# Altium footprint library fszhang.PcbLib: 1032 footprints (part 23 of 66)
Each footprint in its own frame and in the unit in brackets; x right, y up, seen from the top. Pads: shape width x height; smd on the part's side, far side on the other; paste and mask are expansions set on the pad; w line width, h text height; cw(c..) or ccw(c..) is an arc to the next point about the centre after c.
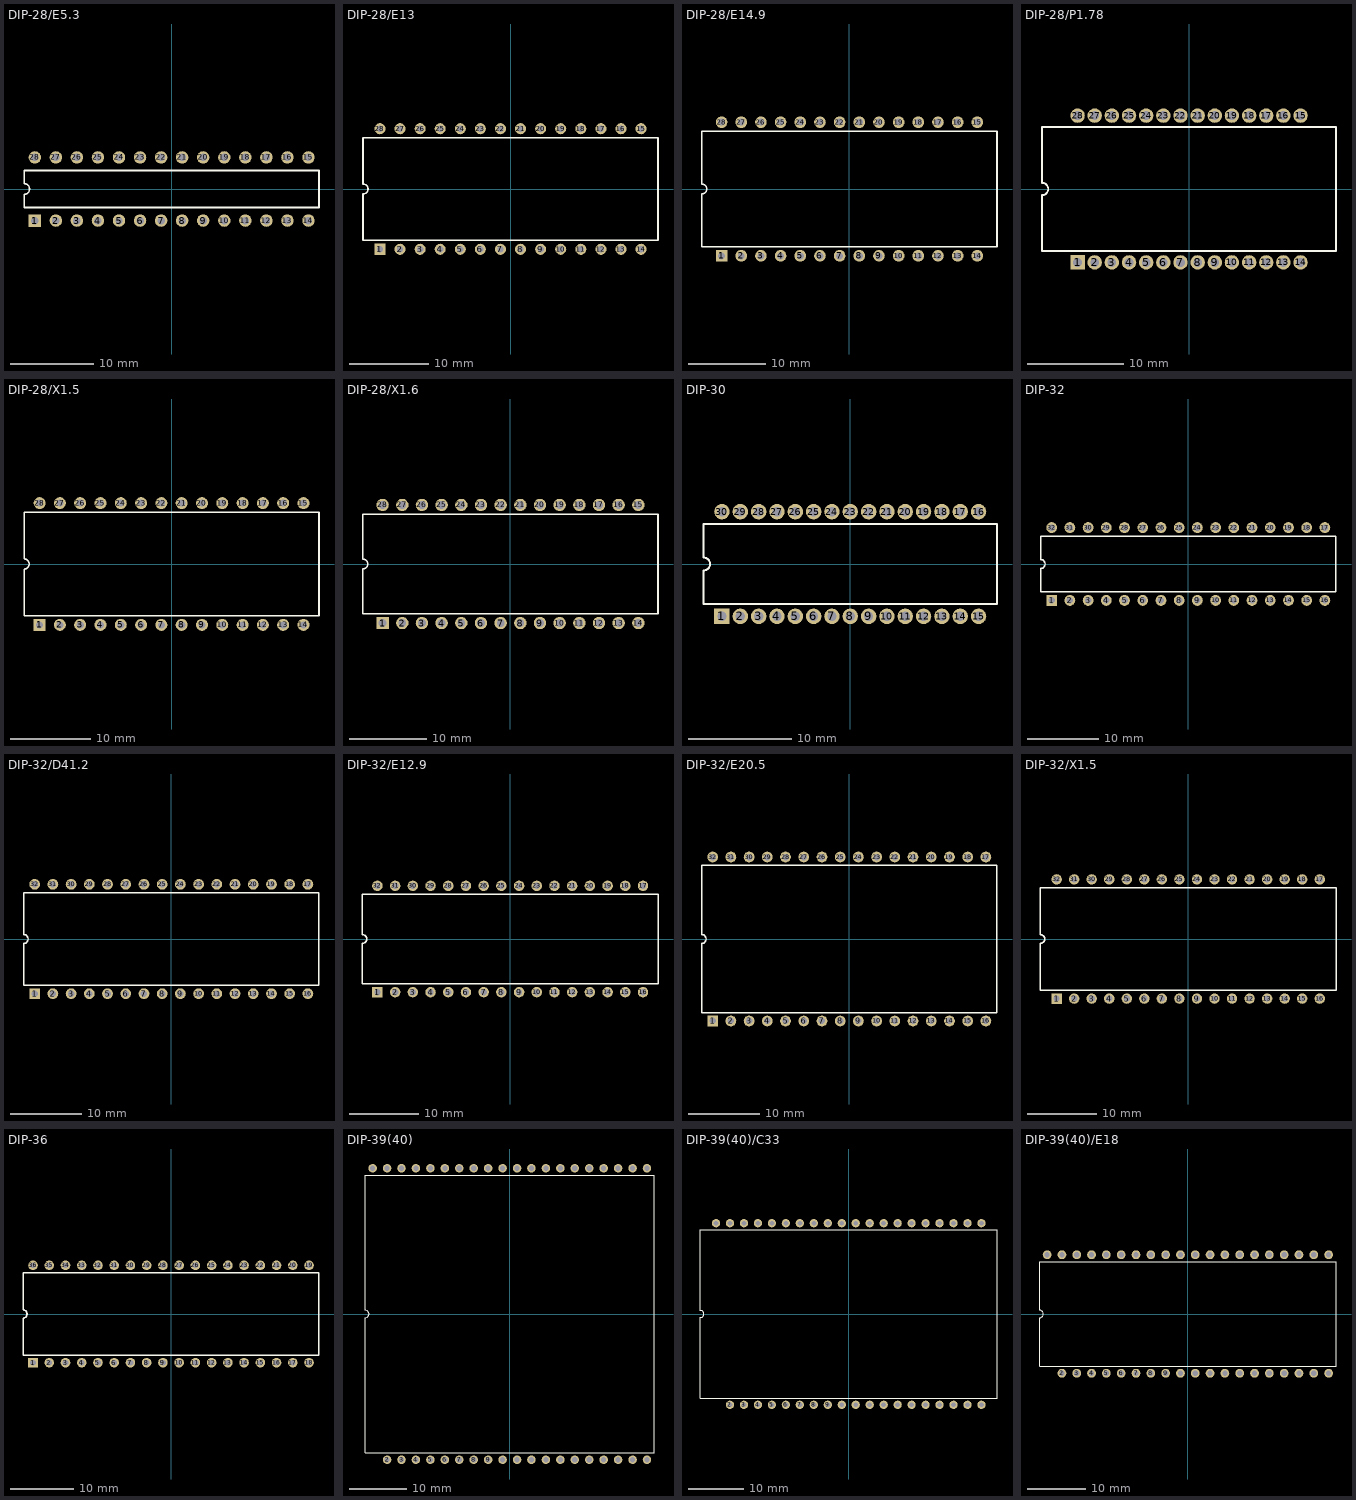
[diagram p22: the footprints below, top view; thin cyan lines are the x and y axes]

## DIP-28/E5.3 [mm]
pads (28):
  rect 1.5x1.5 hole 0.9: 1(-16.51,-3.81)
  round 1.5 hole 0.9: 2(-13.97,-3.81) 3(-11.43,-3.81) 4(-8.89,-3.81) 5(-6.35,-3.81) 6(-3.81,-3.81) 7(-1.27,-3.81) 8(1.27,-3.81) 9(3.81,-3.81) 10(6.35,-3.81) 11(8.89,-3.81) 12(11.43,-3.81) 13(13.97,-3.81) 14(16.51,-3.81) 15(16.51,3.81) 16(13.97,3.81) 17(11.43,3.81) 18(8.89,3.81) 19(6.35,3.81) 20(3.81,3.81) 21(1.27,3.81) 22(-1.27,3.81) 23(-3.81,3.81) 24(-6.35,3.81) 25(-8.89,3.81) 26(-11.43,3.81) 27(-13.97,3.81) 28(-16.51,3.81)
Top Overlay:
  lines w0.2: -17.78,-2.225 17.78,-2.225 17.78,2.225 -17.78,2.225 -17.78,0.635 cw(c-17.78,0) -17.78,-0.635 -17.78,-2.225

## DIP-28/E13 [mm]
pads (28):
  rect 1.4x1.4 hole 0.8: 1(-16.51,-7.62)
  round 1.4 hole 0.8: 2(-13.97,-7.62) 3(-11.43,-7.62) 4(-8.89,-7.62) 5(-6.35,-7.62) 6(-3.81,-7.62) 7(-1.27,-7.62) 8(1.27,-7.62) 9(3.81,-7.62) 10(6.35,-7.62) 11(8.89,-7.62) 12(11.43,-7.62) 13(13.97,-7.62) 14(16.51,-7.62) 15(16.51,7.62) 16(13.97,7.62) 17(11.43,7.62) 18(8.89,7.62) 19(6.35,7.62) 20(3.81,7.62) 21(1.27,7.62) 22(-1.27,7.62) 23(-3.81,7.62) 24(-6.35,7.62) 25(-8.89,7.62) 26(-11.43,7.62) 27(-13.97,7.62) 28(-16.51,7.62)
Top Overlay:
  lines w0.2: -18.65,-6.5 18.65,-6.5 18.65,6.5 -18.65,6.5 -18.65,0.635 cw(c-18.65,0) -18.65,-0.635 -18.65,-6.5

## DIP-28/E14.9 [mm]
pads (28):
  rect 1.5x1.5 hole 0.9: 1(-16.51,-8.625)
  round 1.5 hole 0.9: 2(-13.97,-8.625) 3(-11.43,-8.625) 4(-8.89,-8.625) 5(-6.35,-8.625) 6(-3.81,-8.625) 7(-1.27,-8.625) 8(1.27,-8.625) 9(3.81,-8.625) 10(6.35,-8.625) 11(8.89,-8.625) 12(11.43,-8.625) 13(13.97,-8.625) 14(16.51,-8.625) 15(16.51,8.625) 16(13.97,8.625) 17(11.43,8.625) 18(8.89,8.625) 19(6.35,8.625) 20(3.81,8.625) 21(1.27,8.625) 22(-1.27,8.625) 23(-3.81,8.625) 24(-6.35,8.625) 25(-8.89,8.625) 26(-11.43,8.625) 27(-13.97,8.625) 28(-16.51,8.625)
Top Overlay:
  lines w0.2: -19.05,-7.45 -19.05,-0.635 ccw(c-19.05,0) -19.05,0.635 -19.05,7.45 19.05,7.45 19.05,-7.45 -19.05,-7.45

## DIP-28/P1.78 [mm]
pads (28):
  rect 1.5x1.5 hole 0.9: 1(-11.57,-7.62)
  round 1.5 hole 0.9: 2(-9.79,-7.62) 3(-8.01,-7.62) 4(-6.23,-7.62) 5(-4.45,-7.62) 6(-2.67,-7.62) 7(-0.89,-7.62) 8(0.89,-7.62) 9(2.67,-7.62) 10(4.45,-7.62) 11(6.23,-7.62) 12(8.01,-7.62) 13(9.79,-7.62) 14(11.57,-7.62) 15(11.57,7.62) 16(9.79,7.62) 17(8.01,7.62) 18(6.23,7.62) 19(4.45,7.62) 20(2.67,7.62) 21(0.89,7.62) 22(-0.89,7.62) 23(-2.67,7.62) 24(-4.45,7.62) 25(-6.23,7.62) 26(-8.01,7.62) 27(-9.79,7.62) 28(-11.57,7.62)
Top Overlay:
  lines w0.2: -15.25,-6.45 -15.25,-0.635 ccw(c-15.25,0) -15.25,0.635 -15.25,6.45 15.25,6.45 15.25,-6.45 -15.25,-6.45

## DIP-28/X1.5 [mm]
pads (28):
  rect 1.5x1.5 hole 0.9: 1(-16.51,-7.62)
  round 1.5 hole 0.9: 2(-13.97,-7.62) 3(-11.43,-7.62) 4(-8.89,-7.62) 5(-6.35,-7.62) 6(-3.81,-7.62) 7(-1.27,-7.62) 8(1.27,-7.62) 9(3.81,-7.62) 10(6.35,-7.62) 11(8.89,-7.62) 12(11.43,-7.62) 13(13.97,-7.62) 14(16.51,-7.62) 15(16.51,7.62) 16(13.97,7.62) 17(11.43,7.62) 18(8.89,7.62) 19(6.35,7.62) 20(3.81,7.62) 21(1.27,7.62) 22(-1.27,7.62) 23(-3.81,7.62) 24(-6.35,7.62) 25(-8.89,7.62) 26(-11.43,7.62) 27(-13.97,7.62) 28(-16.51,7.62)
Top Overlay:
  lines w0.2: -18.45,-6.45 -18.45,-0.635 ccw(c-18.45,0) -18.45,0.635 -18.45,6.45 18.45,6.45 18.45,-6.45 -18.45,-6.45

## DIP-28/X1.6 [mm]
pads (28):
  rect 1.6x1.6 hole 1: 1(-16.51,-7.62)
  round 1.6 hole 1: 2(-13.97,-7.62) 3(-11.43,-7.62) 4(-8.89,-7.62) 5(-6.35,-7.62) 6(-3.81,-7.62) 7(-1.27,-7.62) 8(1.27,-7.62) 9(3.81,-7.62) 10(6.35,-7.62) 11(8.89,-7.62) 12(11.43,-7.62) 13(13.97,-7.62) 14(16.51,-7.62) 15(16.51,7.62) 16(13.97,7.62) 17(11.43,7.62) 18(8.89,7.62) 19(6.35,7.62) 20(3.81,7.62) 21(1.27,7.62) 22(-1.27,7.62) 23(-3.81,7.62) 24(-6.35,7.62) 25(-8.89,7.62) 26(-11.43,7.62) 27(-13.97,7.62) 28(-16.51,7.62)
Top Overlay:
  lines w0.2: -19.05,-6.4 -19.05,-0.635 ccw(c-19.05,0) -19.05,0.635 -19.05,6.4 19.05,6.4 19.05,-6.4 -19.05,-6.4

## DIP-30 [mm]
pads (30):
  rect 1.5x1.5 hole 0.9: 1(-12.46,-5.08)
  round 1.5 hole 0.9: 2(-10.68,-5.08) 3(-8.9,-5.08) 4(-7.12,-5.08) 5(-5.34,-5.08) 6(-3.56,-5.08) 7(-1.78,-5.08) 8(0,-5.08) 9(1.78,-5.08) 10(3.56,-5.08) 11(5.34,-5.08) 12(7.12,-5.08) 13(8.9,-5.08) 14(10.68,-5.08) 15(12.46,-5.08) 16(12.46,5.08) 17(10.68,5.08) 18(8.9,5.08) 19(7.12,5.08) 20(5.34,5.08) 21(3.56,5.08) 22(1.78,5.08) 23(0,5.08) 24(-1.78,5.08) 25(-3.56,5.08) 26(-5.34,5.08) 27(-7.12,5.08) 28(-8.9,5.08) 29(-10.68,5.08) 30(-12.46,5.08)
Top Overlay:
  lines w0.2: -14.25,-3.9 14.25,-3.9 14.25,3.9 -14.25,3.9 -14.25,0.635 cw(c-14.25,0) -14.25,-0.635 -14.25,-3.9

## DIP-32 [mm]
pads (32):
  rect 1.5x1.5 hole 0.9: 1(-19.05,-5.08)
  round 1.5 hole 0.9: 2(-16.51,-5.08) 3(-13.97,-5.08) 4(-11.43,-5.08) 5(-8.89,-5.08) 6(-6.35,-5.08) 7(-3.81,-5.08) 8(-1.27,-5.08) 9(1.27,-5.08) 10(3.81,-5.08) 11(6.35,-5.08) 12(8.89,-5.08) 13(11.43,-5.08) 14(13.97,-5.08) 15(16.51,-5.08) 16(19.05,-5.08) 17(19.05,5.08) 18(16.51,5.08) 19(13.97,5.08) 20(11.43,5.08) 21(8.89,5.08) 22(6.35,5.08) 23(3.81,5.08) 24(1.27,5.08) 25(-1.27,5.08) 26(-3.81,5.08) 27(-6.35,5.08) 28(-8.89,5.08) 29(-11.43,5.08) 30(-13.97,5.08) 31(-16.51,5.08) 32(-19.05,5.08)
Top Overlay:
  lines w0.2: -20.6,-3.9 -20.6,-0.635 ccw(c-20.6,0) -20.6,0.635 -20.6,3.9 20.6,3.9 20.6,-3.9 -20.6,-3.9

## DIP-32/D41.2 [mm]
pads (32):
  rect 1.5x1.5 hole 0.9: 1(-19.05,-7.62)
  round 1.5 hole 0.9: 2(-16.51,-7.62) 3(-13.97,-7.62) 4(-11.43,-7.62) 5(-8.89,-7.62) 6(-6.35,-7.62) 7(-3.81,-7.62) 8(-1.27,-7.62) 9(1.27,-7.62) 10(3.81,-7.62) 11(6.35,-7.62) 12(8.89,-7.62) 13(11.43,-7.62) 14(13.97,-7.62) 15(16.51,-7.62) 16(19.05,-7.62) 17(19.05,7.62) 18(16.51,7.62) 19(13.97,7.62) 20(11.43,7.62) 21(8.89,7.62) 22(6.35,7.62) 23(3.81,7.62) 24(1.27,7.62) 25(-1.27,7.62) 26(-3.81,7.62) 27(-6.35,7.62) 28(-8.89,7.62) 29(-11.43,7.62) 30(-13.97,7.62) 31(-16.51,7.62) 32(-19.05,7.62)
Top Overlay:
  lines w0.2: -20.6,-6.45 -20.6,-0.635 ccw(c-20.6,0) -20.6,0.635 -20.6,6.45 20.6,6.45 20.6,-6.45 -20.6,-6.45

## DIP-32/E12.9 [mm]
pads (32):
  rect 1.5x1.5 hole 0.9: 1(-19.05,-7.62)
  round 1.5 hole 0.9: 2(-16.51,-7.62) 3(-13.97,-7.62) 4(-11.43,-7.62) 5(-8.89,-7.62) 6(-6.35,-7.62) 7(-3.81,-7.62) 8(-1.27,-7.62) 9(1.27,-7.62) 10(3.81,-7.62) 11(6.35,-7.62) 12(8.89,-7.62) 13(11.43,-7.62) 14(13.97,-7.62) 15(16.51,-7.62) 16(19.05,-7.62) 17(19.05,7.62) 18(16.51,7.62) 19(13.97,7.62) 20(11.43,7.62) 21(8.89,7.62) 22(6.35,7.62) 23(3.81,7.62) 24(1.27,7.62) 25(-1.27,7.62) 26(-3.81,7.62) 27(-6.35,7.62) 28(-8.89,7.62) 29(-11.43,7.62) 30(-13.97,7.62) 31(-16.51,7.62) 32(-19.05,7.62)
Top Overlay:
  lines w0.2: -21.2,-6.45 21.2,-6.45 21.2,6.45 -21.2,6.45 -21.2,0.635 cw(c-21.2,0) -21.2,-0.635 -21.2,-6.45

## DIP-32/E20.5 [mm]
pads (32):
  rect 1.5x1.5 hole 0.9: 1(-19.05,-11.43)
  round 1.5 hole 0.9: 2(-16.51,-11.43) 3(-13.97,-11.43) 4(-11.43,-11.43) 5(-8.89,-11.43) 6(-6.35,-11.43) 7(-3.81,-11.43) 8(-1.27,-11.43) 9(1.27,-11.43) 10(3.81,-11.43) 11(6.35,-11.43) 12(8.89,-11.43) 13(11.43,-11.43) 14(13.97,-11.43) 15(16.51,-11.43) 16(19.05,-11.43) 17(19.05,11.43) 18(16.51,11.43) 19(13.97,11.43) 20(11.43,11.43) 21(8.89,11.43) 22(6.35,11.43) 23(3.81,11.43) 24(1.27,11.43) 25(-1.27,11.43) 26(-3.81,11.43) 27(-6.35,11.43) 28(-8.89,11.43) 29(-11.43,11.43) 30(-13.97,11.43) 31(-16.51,11.43) 32(-19.05,11.43)
Top Overlay:
  lines w0.2: -20.6,-10.25 -20.6,-0.635 ccw(c-20.6,0) -20.6,0.635 -20.6,10.25 20.6,10.25 20.6,-10.25 -20.6,-10.25

## DIP-32/X1.5 [mm]
pads (32):
  rect 1.5x1.5 hole 0.9: 1(-19.05,-8.625)
  round 1.5 hole 0.9: 2(-16.51,-8.625) 3(-13.97,-8.625) 4(-11.43,-8.625) 5(-8.89,-8.625) 6(-6.35,-8.625) 7(-3.81,-8.625) 8(-1.27,-8.625) 9(1.27,-8.625) 10(3.81,-8.625) 11(6.35,-8.625) 12(8.89,-8.625) 13(11.43,-8.625) 14(13.97,-8.625) 15(16.51,-8.625) 16(19.05,-8.625) 17(19.05,8.625) 18(16.51,8.625) 19(13.97,8.625) 20(11.43,8.625) 21(8.89,8.625) 22(6.35,8.625) 23(3.81,8.625) 24(1.27,8.625) 25(-1.27,8.625) 26(-3.81,8.625) 27(-6.35,8.625) 28(-8.89,8.625) 29(-11.43,8.625) 30(-13.97,8.625) 31(-16.51,8.625) 32(-19.05,8.625)
Top Overlay:
  lines w0.2: -21.4,-7.45 21.4,-7.45 21.4,7.45 -21.4,7.45 -21.4,0.635 cw(c-21.4,0) -21.4,-0.635 -21.4,-7.45

## DIP-36 [mm]
pads (36):
  rect 1.5x1.5 hole 0.9: 1(-21.59,-7.62)
  round 1.5 hole 0.9: 2(-19.05,-7.62) 3(-16.51,-7.62) 4(-13.97,-7.62) 5(-11.43,-7.62) 6(-8.89,-7.62) 7(-6.35,-7.62) 8(-3.81,-7.62) 9(-1.27,-7.62) 10(1.27,-7.62) 11(3.81,-7.62) 12(6.35,-7.62) 13(8.89,-7.62) 14(11.43,-7.62) 15(13.97,-7.62) 16(16.51,-7.62) 17(19.05,-7.62) 18(21.59,-7.62) 19(21.59,7.62) 20(19.05,7.62) 21(16.51,7.62) 22(13.97,7.62) 23(11.43,7.62) 24(8.89,7.62) 25(6.35,7.62) 26(3.81,7.62) 27(1.27,7.62) 28(-1.27,7.62) 29(-3.81,7.62) 30(-6.35,7.62) 31(-8.89,7.62) 32(-11.43,7.62) 33(-13.97,7.62) 34(-16.51,7.62) 35(-19.05,7.62) 36(-21.59,7.62)
Top Overlay:
  lines w0.2: -23.15,-6.45 23.15,-6.45 23.15,6.45 -23.15,6.45 -23.15,0.635 cw(c-23.15,0) -23.15,-0.635 -23.15,-6.45

## DIP-39(40) [mm]
pads (39):
  round 1.5 hole 0.9: 2(-21.59,-25.635) 3(-19.05,-25.635) 4(-16.51,-25.635) 5(-13.97,-25.635) 6(-11.43,-25.635) 7(-8.89,-25.635) 8(-6.35,-25.635) 9(-3.81,-25.635) 10(-1.27,-25.635) 11(1.27,-25.635) 12(3.81,-25.635) 13(6.35,-25.635) 14(8.89,-25.635) 15(11.43,-25.635) 16(13.97,-25.635) 17(16.51,-25.635) 18(19.05,-25.635) 19(21.59,-25.635) 20(24.13,-25.635) 21(24.13,25.635) 22(21.59,25.635) 23(19.05,25.635) 24(16.51,25.635) 25(13.97,25.635) 26(11.43,25.635) 27(8.89,25.635) 28(6.35,25.635) 29(3.81,25.635) 30(1.27,25.635) 31(-1.27,25.635) 32(-3.81,25.635) 33(-6.35,25.635) 34(-8.89,25.635) 35(-11.43,25.635) 36(-13.97,25.635) 37(-16.51,25.635) 38(-19.05,25.635) 39(-21.59,25.635) 40(-24.13,25.635)
Top Overlay:
  lines w0.2: -25.4,-24.45 -25.4,-0.635 ccw(c-25.4,0) -25.4,0.635 -25.4,24.45 25.4,24.45 25.4,-24.45 -25.4,-24.45

## DIP-39(40)/C33 [mm]
pads (39):
  round 1.5 hole 0.9: 2(-21.59,-16.5) 3(-19.05,-16.5) 4(-16.51,-16.5) 5(-13.97,-16.5) 6(-11.43,-16.5) 7(-8.89,-16.5) 8(-6.35,-16.5) 9(-3.81,-16.5) 10(-1.27,-16.5) 11(1.27,-16.5) 12(3.81,-16.5) 13(6.35,-16.5) 14(8.89,-16.5) 15(11.43,-16.5) 16(13.97,-16.5) 17(16.51,-16.5) 18(19.05,-16.5) 19(21.59,-16.5) 20(24.13,-16.5) 21(24.13,16.5) 22(21.59,16.5) 23(19.05,16.5) 24(16.51,16.5) 25(13.97,16.5) 26(11.43,16.5) 27(8.89,16.5) 28(6.35,16.5) 29(3.81,16.5) 30(1.27,16.5) 31(-1.27,16.5) 32(-3.81,16.5) 33(-6.35,16.5) 34(-8.89,16.5) 35(-11.43,16.5) 36(-13.97,16.5) 37(-16.51,16.5) 38(-19.05,16.5) 39(-21.59,16.5) 40(-24.13,16.5)
Top Overlay:
  lines w0.2: -26.95,-15.35 26.95,-15.35 26.95,15.35 -26.95,15.35 -26.95,0.635 cw(c-26.95,0) -26.95,-0.635 -26.95,-15.35

## DIP-39(40)/E18 [mm]
pads (39):
  round 1.5 hole 0.9: 2(-21.59,-10.16) 3(-19.05,-10.16) 4(-16.51,-10.16) 5(-13.97,-10.16) 6(-11.43,-10.16) 7(-8.89,-10.16) 8(-6.35,-10.16) 9(-3.81,-10.16) 10(-1.27,-10.16) 11(1.27,-10.16) 12(3.81,-10.16) 13(6.35,-10.16) 14(8.89,-10.16) 15(11.43,-10.16) 16(13.97,-10.16) 17(16.51,-10.16) 18(19.05,-10.16) 19(21.59,-10.16) 20(24.13,-10.16) 21(24.13,10.16) 22(21.59,10.16) 23(19.05,10.16) 24(16.51,10.16) 25(13.97,10.16) 26(11.43,10.16) 27(8.89,10.16) 28(6.35,10.16) 29(3.81,10.16) 30(1.27,10.16) 31(-1.27,10.16) 32(-3.81,10.16) 33(-6.35,10.16) 34(-8.89,10.16) 35(-11.43,10.16) 36(-13.97,10.16) 37(-16.51,10.16) 38(-19.05,10.16) 39(-21.59,10.16) 40(-24.13,10.16)
Top Overlay:
  lines w0.2: -25.4,-9 -25.4,-0.635 ccw(c-25.4,0) -25.4,0.635 -25.4,9 25.4,9 25.4,-9 -25.4,-9